# Altium footprint library Miscellaneous Devices LC.PcbLib: 776 footprints (part 12 of 49)
Each footprint in its own frame and in the unit in brackets; x right, y up, seen from the top. Pads: shape width x height; smd on the part's side, far side on the other; paste and mask are expansions set on the pad; w line width, h text height; cw(c..) or ccw(c..) is an arc to the next point about the centre after c.
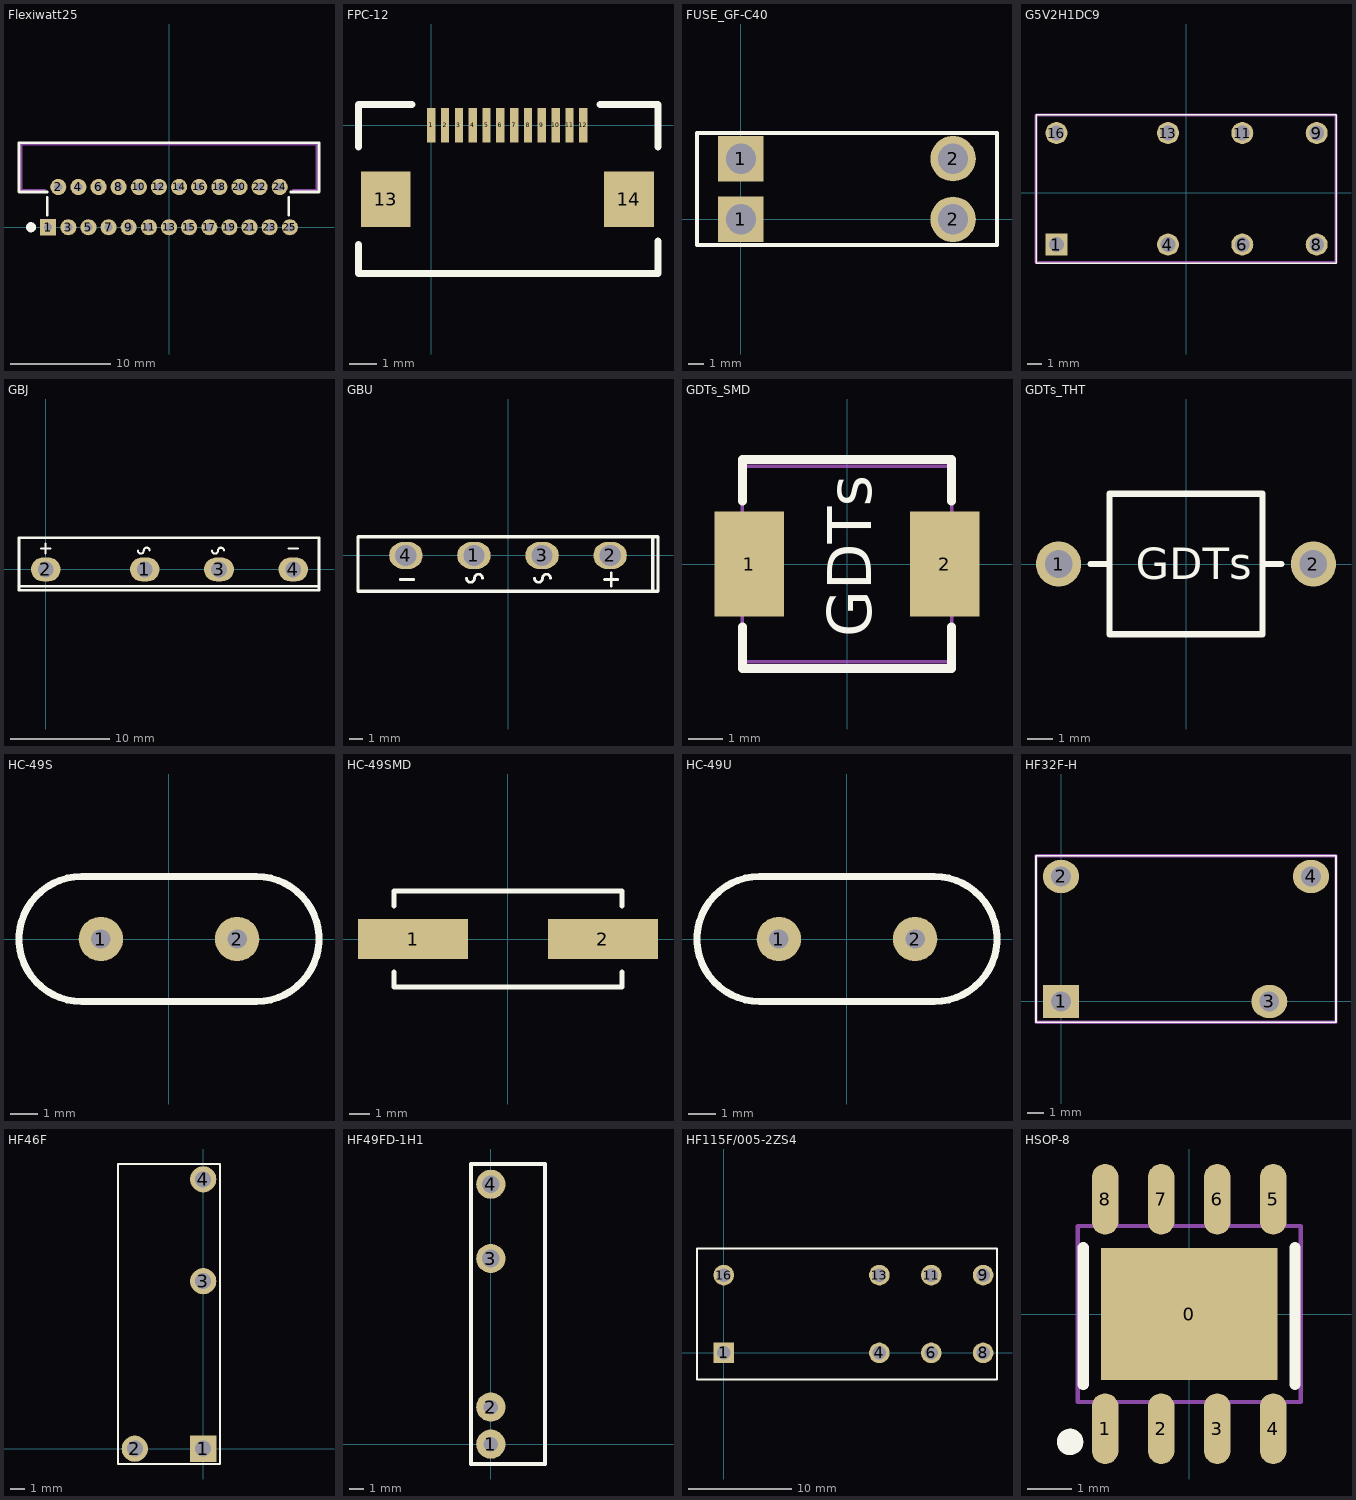
[diagram p11: the footprints below, top view; thin cyan lines are the x and y axes]

## Flexiwatt25 [mm] "Stepping Motor Driver IC"
pads (25):
  rect 1.6x1.6 hole 0.8: 1(-12,0)
  round 1.6 hole 0.8: 2(-11,4) 3(-10,0) 4(-9,4) 5(-8,0) 6(-7,4) 7(-6,0) 8(-5,4) 9(-4,0) 10(-3,4) 11(-2,0) 12(-1,4) 13(0,0) 14(1,4) 15(2,0) 16(3,4) 17(4,0) 18(5,4) 19(6,0) 20(7,4) 21(8,0) 22(9,4) 23(10,0) 24(11,4) 25(12,0)
Top Overlay:
  circle w0.5: c-13.7,0 r0.25
  lines w0.254: -12.1,1.2 -12.1,3 ; -12.1,3.5 -14.9,3.5 -14.9,8.4 14.9,8.4 14.9,3.5 12.1,3.5 ; 11.9,1.2 11.9,3
Mechanical 13:
  lines w0.2: -12.3,3.7 -14.65,3.7 -14.65,8.2 14.65,8.2 14.65,3.7 12.3,3.7

## FPC-12 [mm]
pads (14):
  rect 0.3x1.25 smd: 1(0,0) 2(0.5,0) 3(1,0) 4(1.5,0) 5(2,0) 6(2.5,0) 7(3,0) 8(3.5,0) 9(4,0) 10(4.5,0) 11(5,0) 12(5.5,0)
  rect 1.8x2 smd: 13(-1.65,-2.675) 14(7.15,-2.675)
Top Overlay:
  lines w0.254: -2.625,-4.3 -2.625,-5.35 8.125,-5.35 ; -2.625,-0.775 -2.625,0.75 -0.7,0.75 ; 6.1,0.75 8.2,0.75 8.2,-0.775 ; 8.2,-5.35 8.2,-4.175

## FUSE_GF-C40 [mm]
pads (4):
  rect 3x3 hole 2: 1(0,0) 1(0,4)
  round 3 hole 2: 2(14,0) 2(14,4)
Top Overlay:
  lines w0.254: -2.9,-1.7 16.9,-1.7 16.9,5.7 -2.9,5.7 -2.9,-1.7

## G5V2H1DC9 [mm]
pads (8):
  rect 1.5x1.5 hole 1: 1(-8.85,-3.535)
  round 1.5 hole 1: 4(-1.23,-3.535) 6(3.85,-3.535) 8(8.93,-3.535) 9(8.93,4.085) 11(3.85,4.085) 13(-1.23,4.085) 16(-8.85,4.085)
Top Overlay:
  lines w0.1: -10.25,-4.805 10.25,-4.805 10.25,5.325 -10.25,5.325 -10.25,-4.805
Mechanical 15:
  lines w0.2: -10.25,-4.775 10.25,-4.775 10.25,5.325 -10.25,5.325 -10.25,-4.775
3D body "G5V-2-DC12.stp": height 11, standoff -5, extent -10.25,-4.775 10.25,5.325

## GBJ [mm]
pads (4):
  oval 3x2.4 hole 1.6: 1(10,0) 2(0,0) 3(17.5,0) 4(25,0)
Top Overlay:
  lines w0.203: -0.5,2.1 0.5,2.1 ; 0,1.6 0,2.6 ; 9.3,1.9 ccw(c9.6,1.9) 9.9,1.9 cw(c10.2,1.9) 10.5,1.9 ; 16.8,1.9 ccw(c17.1,1.9) 17.4,1.9 cw(c17.7,1.9) 18,1.9 ; 24.5,2.1 25.5,2.1
  lines w0.254: -2.7,-1.7 27.6,-1.7 ; -2.7,-2.1 -2.7,3.2 27.6,3.2 27.6,-2.1 -2.7,-2.1

## GBU [mm]
pads (4):
  oval 2.5x2 hole 1.6: 1(-2.54,0) 2(7.62,0) 3(2.54,0) 4(-7.62,0)
Top Overlay:
  lines w0.203: -8.04,-1.8 -7.04,-1.8 ; -3.1,-1.7 ccw(c-2.8,-1.7) -2.5,-1.7 cw(c-2.2,-1.7) -1.9,-1.7 ; 1.98,-1.7 ccw(c2.28,-1.7) 2.58,-1.7 cw(c2.88,-1.7) 3.18,-1.7 ; 7.2,-1.8 8.2,-1.8 ; 7.7,-2.3 7.7,-1.3
  lines w0.254: 10.8,-2.67 10.8,1.3 ; -11.2,-2.67 11.2,-2.67 11.2,1.4 -11.2,1.4 -11.2,-2.67

## GDTs_SMD [mm]
pads (2):
  rect 2x3 smd: 1(-2.8,0) 2(2.8,0)
Top Overlay:
  lines w0.254: -3,-1.8 -3,-3 3,-3 3,-1.8 ; -3,1.8 -3,3 3,3 3,1.8
  text "GDTs" at 0.7,-2.1 h1.27
Mechanical 13:
  lines w0.1: -3,-2.8 3,-2.8 3,2.8 -3,2.8 -3,-2.8

## GDTs_THT [mm]
pads (2):
  round 1.8 hole 1.1: 1(-5.08,0) 2(5.08,0)
Top Overlay:
  lines w0.254: -3.8,0 -3.048,0 ; 3.048,0 3.8,0 ; -3.048,-2.794 -3.048,2.794 3.048,2.794 3.048,-2.794 -3.048,-2.794
  text "GDTs" at -2,-0.6 h1.27

## HC-49S [mm]
pads (2):
  round 1.6 hole 0.7: 1(-2.45,0) 2(2.45,0)
Top Overlay:
  lines w0.254: -3.15,-2.248 cw(c-3.15,0) -3.15,2.248 3.15,2.248 cw(c3.15,0) 3.15,-2.248 -3.15,-2.248
3D body "hc-49s_n.stp": height 3.6, standoff -2.9, extent -5.388,-2.27 5.412,2.23

## HC-49SMD [mm]
pads (2):
  rect 5.5x2 smd: 1(-4.75,0) 2(4.75,0)
Top Overlay:
  lines w0.254: -5.7,-1.65 -5.7,-2.4 5.7,-2.4 5.7,-1.65 ; -5.7,1.65 -5.7,2.4 5.7,2.4 5.7,1.65
3D body "User Library-hc49_cystal.STEP": height 4, standoff 0, extent -6.7,-2.462 6.7,2.438

## HC-49U [mm]
pads (2):
  round 1.6 hole 0.7: 1(-2.45,0) 2(2.45,0)
Top Overlay:
  lines w0.254: -3.15,-2.248 cw(c-3.15,0) -3.15,2.248 3.15,2.248 cw(c3.15,0) 3.15,-2.248 -3.15,-2.248
3D body "hc-49u_n.stp": height 13.1, standoff -2.9, extent -5.398,-2.245 5.402,2.255

## HF32F-H [mm]
pads (4):
  rect 2.2x2 hole 1.2: 1(0,0)
  oval 2.2x2 hole 1.2: 2(0,7.62) 3(12.7,0) 4(15.24,7.62)
Top Overlay:
  lines w0.1: -1.524,-1.27 16.764,-1.27 16.764,8.89 -1.524,8.89 -1.524,-1.27
Mechanical 15:
  lines w0.2: -1.524,-1.27 16.764,-1.27 16.764,8.89 -1.524,8.89 -1.524,-1.27
3D body "HF32F.STP": height 15.76, standoff -3.54, extent -1.58,-1.29 16.82,8.91

## HF46F [mm]
pads (4):
  rect 1.8x1.8 hole 1.1: 1(0,0)
  round 1.8 hole 1.1: 2(-4.7,0) 3(0,11.5) 4(0,18.5)
Top Overlay:
  lines w0.127: 1.15,-1.05 -5.85,-1.05 -5.85,19.55 1.15,19.55 1.15,-1.025
3D body "HF46F[1].stp": height 14.79, standoff -3.92, extent -5.9,-0.875 1.1,19.525

## HF49FD-1H1 [mm]
pads (4):
  round 2 hole 1: 1(0,0) 2(0,2.54)
  round 2 hole 1.2: 3(0,12.7) 4(0,17.78)
Top Overlay:
  lines w0.254: -1.348,-1.354 3.7,-1.354 3.7,19.165 -1.348,19.165 -1.348,-1.354
3D body "HF49FD[1].stp": height 12.5, standoff -3.5, extent -1.2,-1.1 3.8,18.9

## HF115F/005-2ZS4 [mm]
pads (8):
  rect 2x2 hole 1.3: 1(0,0)
  round 2 hole 1.3: 4(15.12,0) 6(20.16,0) 8(25.2,0) 9(25.2,7.56) 11(20.16,7.56) 13(15.12,7.56) 16(0,7.56)
Top Overlay:
  lines w0.2: -2.6,10.125 26.55,10.125 26.55,-2.57 -2.375,-2.57 -2.6,-2.57 -2.6,10.13
3D body "HF115F[9].stp": height 14.9, standoff -4.7, extent -2.525,-2.575 26.475,10.025

## HSOP-8 [mm]
pads (9):
  rect 4x3 smd: 0(0,0)
  oval 0.6x1.6 smd: 1(-1.905,-2.6) 2(-0.635,-2.6) 3(0.635,-2.6) 4(1.905,-2.6) 5(1.905,2.6) 6(0.635,2.6) 7(-0.635,2.6) 8(-1.905,2.6)
Top Overlay:
  circle w0.3: c-2.7,-2.9 r0.15
  lines w0.254: -2.4,-1.6 -2.4,1.5 ; 2.4,-1.6 2.4,1.5
Mechanical 13:
  lines w0.1: -2.525,-1.995 -2.525,1.995 2.525,1.995 2.525,-1.995 -2.525,-1.995